# Altium footprint library 5ko.PcbLib: 126 footprints (part 1 of 8)
Each footprint in its own frame and in the unit in brackets; x right, y up, seen from the top. Pads: shape width x height; smd on the part's side, far side on the other; paste and mask are expansions set on the pad; w line width, h text height; cw(c..) or ccw(c..) is an arc to the next point about the centre after c.
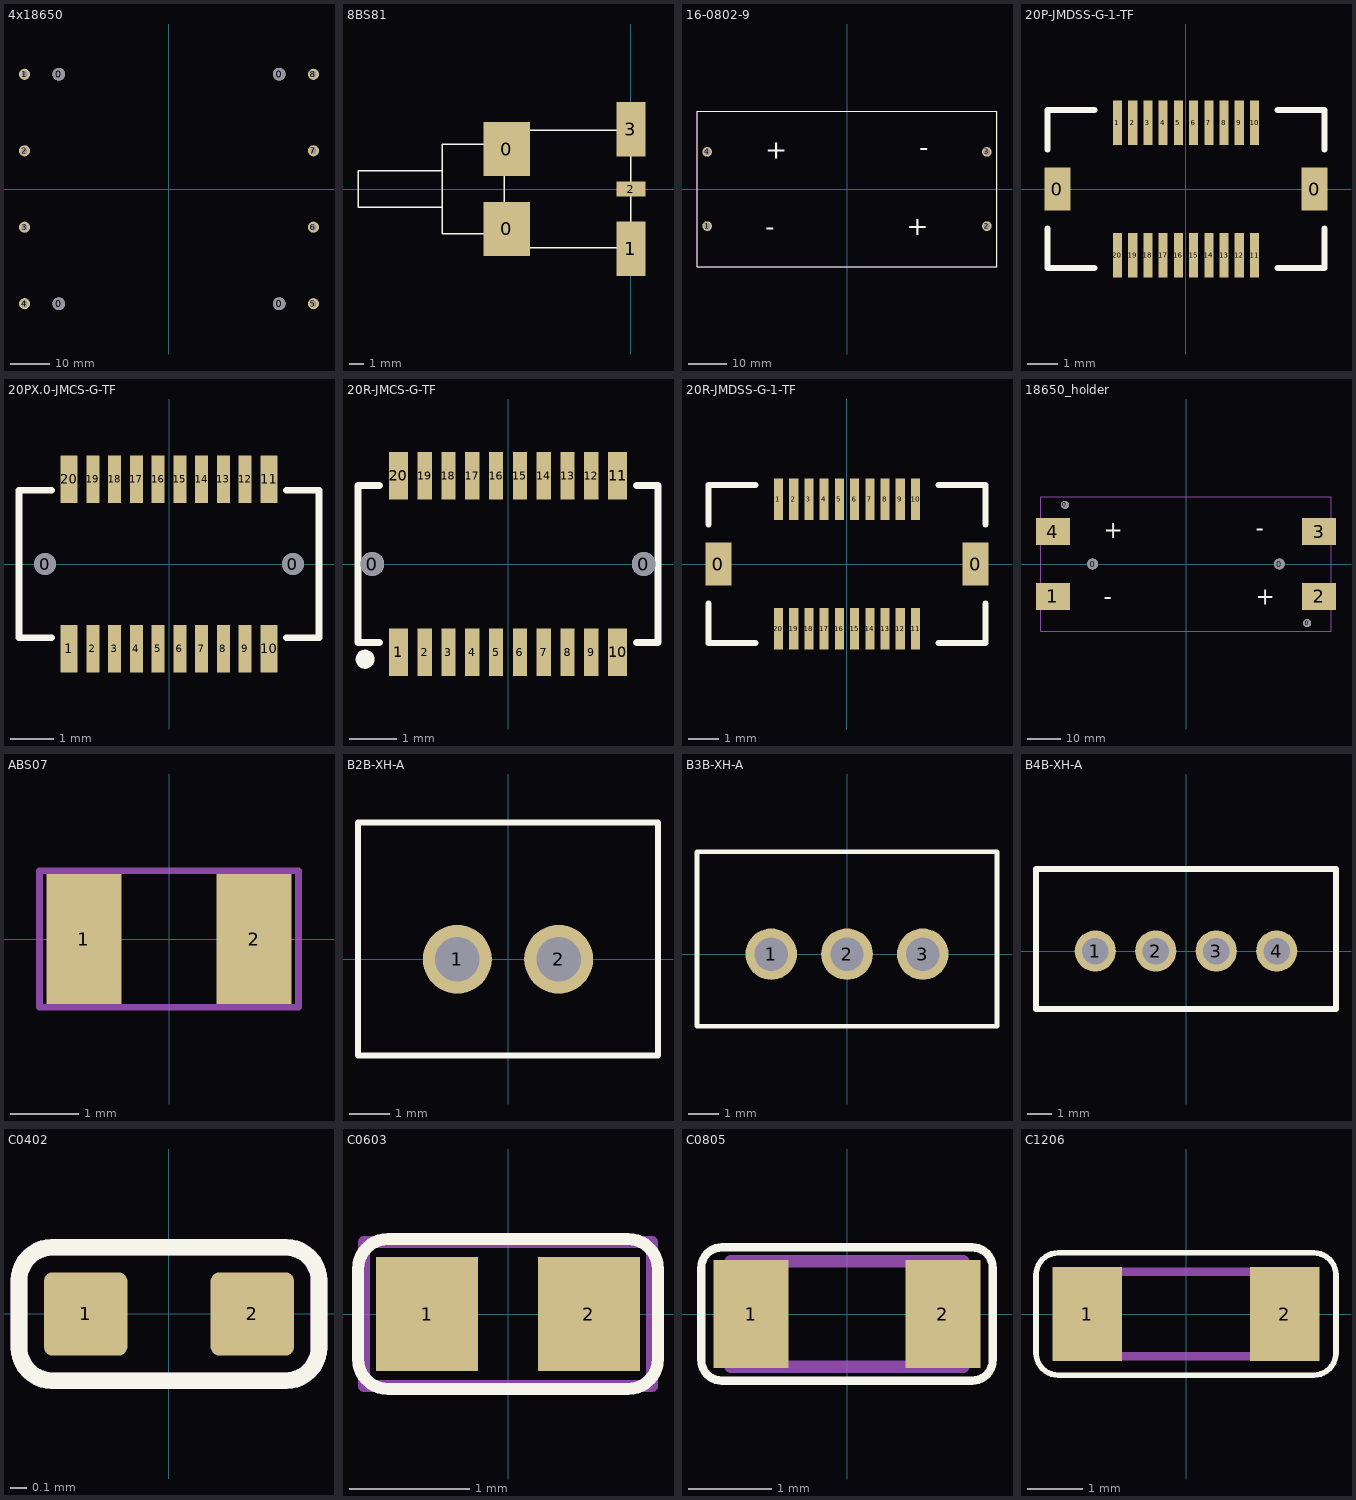
[diagram p0: the footprints below, top view; thin cyan lines are the x and y axes]

## 4x18650 [mm] "Holder 4x18650"
height 21.54
pads (12):
  round 3.2 hole 3.2 unplated mask+0.1: 0(-27.805,-28.95) 0(-27.805,28.95) 0(27.805,-28.95) 0(27.805,28.95)
  round 2.8 hole 1.6 mask+0.1: 1(-36.45,28.95) 2(-36.45,9.65) 3(-36.45,-9.65) 4(-36.45,-28.95) 5(36.45,-28.95) 6(36.45,-9.65) 7(36.45,9.65) 8(36.45,28.95)
3D body "BATx4.4.stp": height 21.54, standoff -2.5, extent -38.99,-39.42 38.99,39.42

## 8BS81 [mm] "Button"
pads (5):
  rect 3.25x3.81 smd: 0(-8.7,-2.8) 0(-8.7,2.8)
  rect 2.03x3.81 smd: 1(0,-4.195) 3(0,4.195)
  rect 2.03x1.02 smd: 2(0,0)
Top Overlay:
  lines w0.1: -13.25,-1.27 -19.15,-1.27 -19.15,1.27 -13.25,1.27 ; -8.9,-3.15 -13.25,-3.15 -13.25,3.15 -8.9,3.15 ; -8.9,-4.115 -8.9,4.115 0,4.115 0,-4.115 -8.9,-4.115
3D body: height 4.42, standoff 1.88, extent -19.15,-1.275 -13.25,1.275
3D body: height 6.2, standoff 0, extent -13.25,-3.15 -8.9,3.15
3D body: height 6.2, standoff 0, extent -8.9,-4.125 0,4.125

## 16-0802-9 [mm] "18650 holder"
height 18
pads (4):
  round 2.5 hole 1.6: 1(-36.25,-9.65) 2(36.25,-9.65) 3(36.25,9.65) 4(-36.25,9.65)
Top Overlay:
  lines w0.15: -38.85,-20.1 -38.85,20.1 38.85,20.1 38.85,-20.1 -38.85,-20.1
  text "+" at -21.25,11.95 h5
  text "-" at -21.25,-12.15 h5
  text "+" at 21.25,-11.95 h5
  text "-" at 21.25,12.15 h5
Mechanical 15:
  lines w0.1: -38.9,-20.1 38.9,-20.1 38.9,20.1 -38.9,20.1 -38.9,-20.1
  text ".Designator" at -21,-0.9 h5
3D body "18650-1.step": height 19, standoff 1, extent -32.45,-18.4 32.65,-0.4
3D body "BK-18650-PC4.stp": height 21.59, standoff -3.17, extent -38.862,-20.066 38.862,20.066
3D body "18650-1.step": height 19, standoff 1, extent -32.65,0.4 32.45,18.4

## 20P-JMDSS-G-1-TF [mm] "20 pin plug"
pads (22):
  rect 0.85x1.4 smd: 0(-4.225,0) 0(4.225,0)
  rect 0.3x1.45 smd: 1(-2.25,2.175) 2(-1.75,2.175) 3(-1.25,2.175) 4(-0.75,2.175) 5(-0.25,2.175) 6(0.25,2.175) 7(0.75,2.175) 8(1.25,2.175) 9(1.75,2.175) 10(2.25,2.175) 11(2.25,-2.175) 12(1.75,-2.175) 13(1.25,-2.175) 14(0.75,-2.175) 15(0.25,-2.175) 16(-0.25,-2.175) 17(-0.75,-2.175) 18(-1.25,-2.175) 19(-1.75,-2.175) 20(-2.25,-2.175)
Top Overlay:
  lines w0.2: -4.55,-1.3 -4.55,-2.6 -3,-2.6 ; -4.55,1.3 -4.55,2.6 -3,2.6 ; 3,-2.6 4.55,-2.6 4.55,-1.3 ; 3,2.6 4.55,2.6 4.55,1.3

## 20PX.0-JMCS-G-TF [mm] "20 pin board-to-board plug"
height 2.2
pads (22):
  round 0.5 hole 0.5 unplated mask+0.1: 0(-2.85,0) 0(2.85,0)
  rect 0.4x1.1 smd mask+0.1: 1(-2.3,-1.95) 10(2.3,-1.95) 11(2.3,1.95) 20(-2.3,1.95)
  rect 0.3x1.1 smd mask+0.1: 2(-1.75,-1.95) 3(-1.25,-1.95) 4(-0.75,-1.95) 5(-0.25,-1.95) 6(0.25,-1.95) 7(0.75,-1.95) 8(1.25,-1.95) 9(1.75,-1.95) 12(1.75,1.95) 13(1.25,1.95) 14(0.75,1.95) 15(0.25,1.95) 16(-0.25,1.95) 17(-0.75,1.95) 18(-1.25,1.95) 19(-1.75,1.95)
Top Overlay:
  lines w0.15: -2.7,-1.7 -3.45,-1.7 -3.45,1.7 -2.7,1.7 ; 2.7,-1.7 3.45,-1.7 3.45,1.7 2.7,1.7
3D body: height 2.3, standoff 0.1, extent -3.45,-1.7 3.45,1.7

## 20R-JMCS-G-TF [mm] "20 pin board-to-board receptacle"
height 2.3
pads (22):
  round 0.5 hole 0.5 unplated mask+0.1: 0(-2.85,0) 0(2.85,0)
  rect 0.4x1 smd mask+0.1: 1(-2.3,-1.85) 10(2.3,-1.85) 11(2.3,1.85) 20(-2.3,1.85)
  rect 0.3x1 smd mask+0.1: 2(-1.75,-1.85) 3(-1.25,-1.85) 4(-0.75,-1.85) 5(-0.25,-1.85) 6(0.25,-1.85) 7(0.75,-1.85) 8(1.25,-1.85) 9(1.75,-1.85) 12(1.75,1.85) 13(1.25,1.85) 14(0.75,1.85) 15(0.25,1.85) 16(-0.25,1.85) 17(-0.75,1.85) 18(-1.25,1.85) 19(-1.75,1.85)
Top Overlay:
  circle w0.2: c-3,-2 r0.1
  lines w0.15: -2.7,-1.65 -3.15,-1.65 -3.15,1.65 -2.7,1.65 ; 2.7,-1.65 3.15,-1.65 3.15,1.65 2.7,1.65
3D body: height 2.3, standoff 0.1, extent -3.15,-1.65 3.15,1.65

## 20R-JMDSS-G-1-TF [mm] "20 pin Receptacle"
pads (22):
  rect 0.85x1.4 smd: 0(-4.225,0) 0(4.225,0)
  rect 0.3x1.35 smd: 1(-2.25,2.125) 2(-1.75,2.125) 3(-1.25,2.125) 4(-0.75,2.125) 5(-0.25,2.125) 6(0.25,2.125) 7(0.75,2.125) 8(1.25,2.125) 9(1.75,2.125) 10(2.25,2.125) 11(2.25,-2.125) 12(1.75,-2.125) 13(1.25,-2.125) 14(0.75,-2.125) 15(0.25,-2.125) 16(-0.25,-2.125) 17(-0.75,-2.125) 18(-1.25,-2.125) 19(-1.75,-2.125) 20(-2.25,-2.125)
Top Overlay:
  lines w0.2: -4.55,-1.3 -4.55,-2.6 -3,-2.6 ; -4.55,1.3 -4.55,2.6 -3,2.6 ; 3,-2.6 4.55,-2.6 4.55,-1.3 ; 3,2.6 4.55,2.6 4.55,1.3

## 18650_holder [mm]
height 18
pads (8):
  round 2.4 hole 2.4 unplated: 0(-35.8,17.5) 0(35.8,-17.5)
  round 3.2 hole 3.2 unplated: 0(-27.6,0) 0(27.6,0)
  rect 10x8 smd: 1(-39.35,-9.55) 2(39.35,-9.55) 3(39.35,9.55) 4(-39.35,9.55)
Top Overlay:
  text "+" at 20.65,-12.05 h5
  text "-" at -24.35,-12.05 h5
  text "+" at -24.35,12.05 h5
  text "-" at 20.65,12.05 h5
Mechanical 15:
  lines w0.1: -42.95,-19.85 -42.95,19.85 42.95,19.85 42.95,-19.85 -42.95,-19.85
  text ".Designator" at -14.3,-1.7 h5
3D body "18650_holder.STEP": height 14.93, standoff -1.48, extent -43.002,-19.888 43.002,19.888
3D body "18650-1.step": height 19, standoff 1, extent -32.525,-18.475 32.575,-0.475
3D body "18650-1.step": height 19, standoff 1, extent -32.575,0.475 32.525,18.475

## ABS07 [mm] "32.768"
pads (2):
  rect 1.1x1.9 smd: 1(-1.25,0) 2(1.25,0)
Mechanical 15:
  lines w0.1: -1.9,-1 1.9,-1 1.9,1 -1.9,1 -1.9,-1
  text ".Designator" at -1.7,-0.1 h0.5
3D body "ABS07.STEP": height 0.91, standoff 0, extent -1.61,-0.76 1.61,0.76

## B2B-XH-A [mm] "2 pin DC plug"
pads (2):
  round 1.7 hole 1.1: 1(-1.25,0) 2(1.25,0)
Top Overlay:
  lines w0.15: -3.7,-2.375 3.7,-2.375 3.7,3.375 -3.7,3.375 -3.7,-2.375
3D body "B2B.step": height 7, standoff -3.3, extent -3.7,-2.375 3.7,3.375

## B3B-XH-A [mm] "3 pin DC plug"
pads (3):
  round 1.7 hole 1.1: 1(-2.5,0) 2(0,0) 3(2.5,0)
Top Overlay:
  lines w0.15: -4.95,-2.375 -4.95,3.375 4.95,3.375 4.95,-2.375 -4.95,-2.375
3D body "B3B.step": height 7, standoff -3.3, extent -4.95,-2.375 4.95,3.375

## B4B-XH-A [mm] "4 pin DC plug"
pads (4):
  round 1.7 hole 1.1: 1(-3.75,0) 2(-1.25,0) 3(1.25,0) 4(3.75,0)
Top Overlay:
  lines w0.254: -6.2,-2.4 6.2,-2.4 6.2,3.4 -6.2,3.4 -6.2,-2.4
3D body "User Library-B4B-XH-A.STEP": height 7, standoff -3.4, extent -6.2,-2.35 6.2,3.4

## C0402 [mm]
pads (2):
  rrect20% 0.5x0.5 smd: 1(-0.5,0) 2(0.5,0)
Top Overlay:
  lines w0.1: -0.9,-0.2 ccw(c-0.7,-0.2) -0.7,-0.4 0.7,-0.4 ccw(c0.7,-0.2) 0.9,-0.2 0.9,0.2 ccw(c0.7,0.2) 0.7,0.4 -0.7,0.4 ccw(c-0.7,0.2) -0.9,0.2 -0.9,-0.2
Mechanical 15:
  lines w0.1: -0.9,-0.2 ccw(c-0.7,-0.2) -0.7,-0.4 0.7,-0.4 ccw(c0.7,-0.2) 0.9,-0.2 0.9,0.2 ccw(c0.7,0.2) 0.7,0.4 -0.7,0.4 ccw(c-0.7,0.2) -0.9,0.2 -0.9,-0.2
  text ".Designator" at -0.6,0 h0.3
3D body "User Library-SMD CAPACITOR 0402.step": height 0.48, standoff -0.02, extent -0.5,-0.25 0.5,0.25

## C0603 [mm]
pads (2):
  rect 0.85x0.95 smd: 1(-0.675,0) 2(0.675,0)
Top Overlay:
  lines w0.1: -1.25,-0.375 ccw(c-1,-0.375) -1,-0.625 1,-0.625 ccw(c1,-0.375) 1.25,-0.375 1.25,0.375 ccw(c1,0.375) 1,0.625 -1,0.625 ccw(c-1,0.375) -1.25,0.375 -1.25,-0.375
Mechanical 15:
  lines w0.1: -1.2,-0.6 -1.2,0.6 1.2,0.6 1.2,-0.6 -1.2,-0.6
  text ".Designator" at -0.7,-0.1 h0.3
3D body "cap0603.step": height 0.9, standoff 0, extent -0.8,-0.4 0.8,0.4

## C0805 [mm] "Chip Capacitor, 2-Leads, Body 2,00x1,25mm, IPC Medium Density"
height 1.45
pads (2):
  rect 0.9x1.3 smd: 1(-1.15,0) 2(1.15,0)
Top Overlay:
  lines w0.1: -1.75,-0.55 ccw(c-1.5,-0.55) -1.5,-0.8 1.5,-0.8 ccw(c1.5,-0.55) 1.75,-0.55 1.75,0.55 ccw(c1.5,0.55) 1.5,0.8 -1.5,0.8 ccw(c-1.5,0.55) -1.75,0.55 -1.75,-0.55
Mechanical 15:
  lines w0.15: -1.397,-0.635 1.397,-0.635 1.397,0.635 -1.397,0.635 -1.397,-0.635
  text ".Designator" at -1.319,-0.1 h0.3
3D body "Chip Capacitor 0805.step": height 1.32, standoff 0, extent -1,-0.635 1,0.635

## C1206 [mm] "Chip Capacitor, 2-Leads, Body 3,20x1,60mm, IPC Medium Density"
height 1.75
pads (2):
  rect 1.25x1.7 smd: 1(-1.775,0) 2(1.775,0)
Top Overlay:
  lines w0.1: -2.7,-0.7 ccw(c-2.3,-0.7) -2.3,-1.1 2.3,-1.1 ccw(c2.3,-0.7) 2.7,-0.7 2.7,0.7 ccw(c2.3,0.7) 2.3,1.1 -2.3,1.1 ccw(c-2.3,0.7) -2.7,0.7 -2.7,-0.7
Mechanical 15:
  lines w0.15: -1.905,-0.762 -1.905,0.762 1.905,0.762 1.905,-0.762 -1.905,-0.762
  text ".Designator" at -1.7,-0.1 h0.5
3D body "Chip Capacitor 1206.step": height 1.52, standoff 0, extent -1.6,-0.81 1.6,0.81